# Altium footprint library Connectors.PcbLib: 218 footprints (part 3 of 14)
Each footprint in its own frame and in the unit in brackets; x right, y up, seen from the top. Pads: shape width x height; smd on the part's side, far side on the other; paste and mask are expansions set on the pad; w line width, h text height; cw(c..) or ccw(c..) is an arc to the next point about the centre after c.
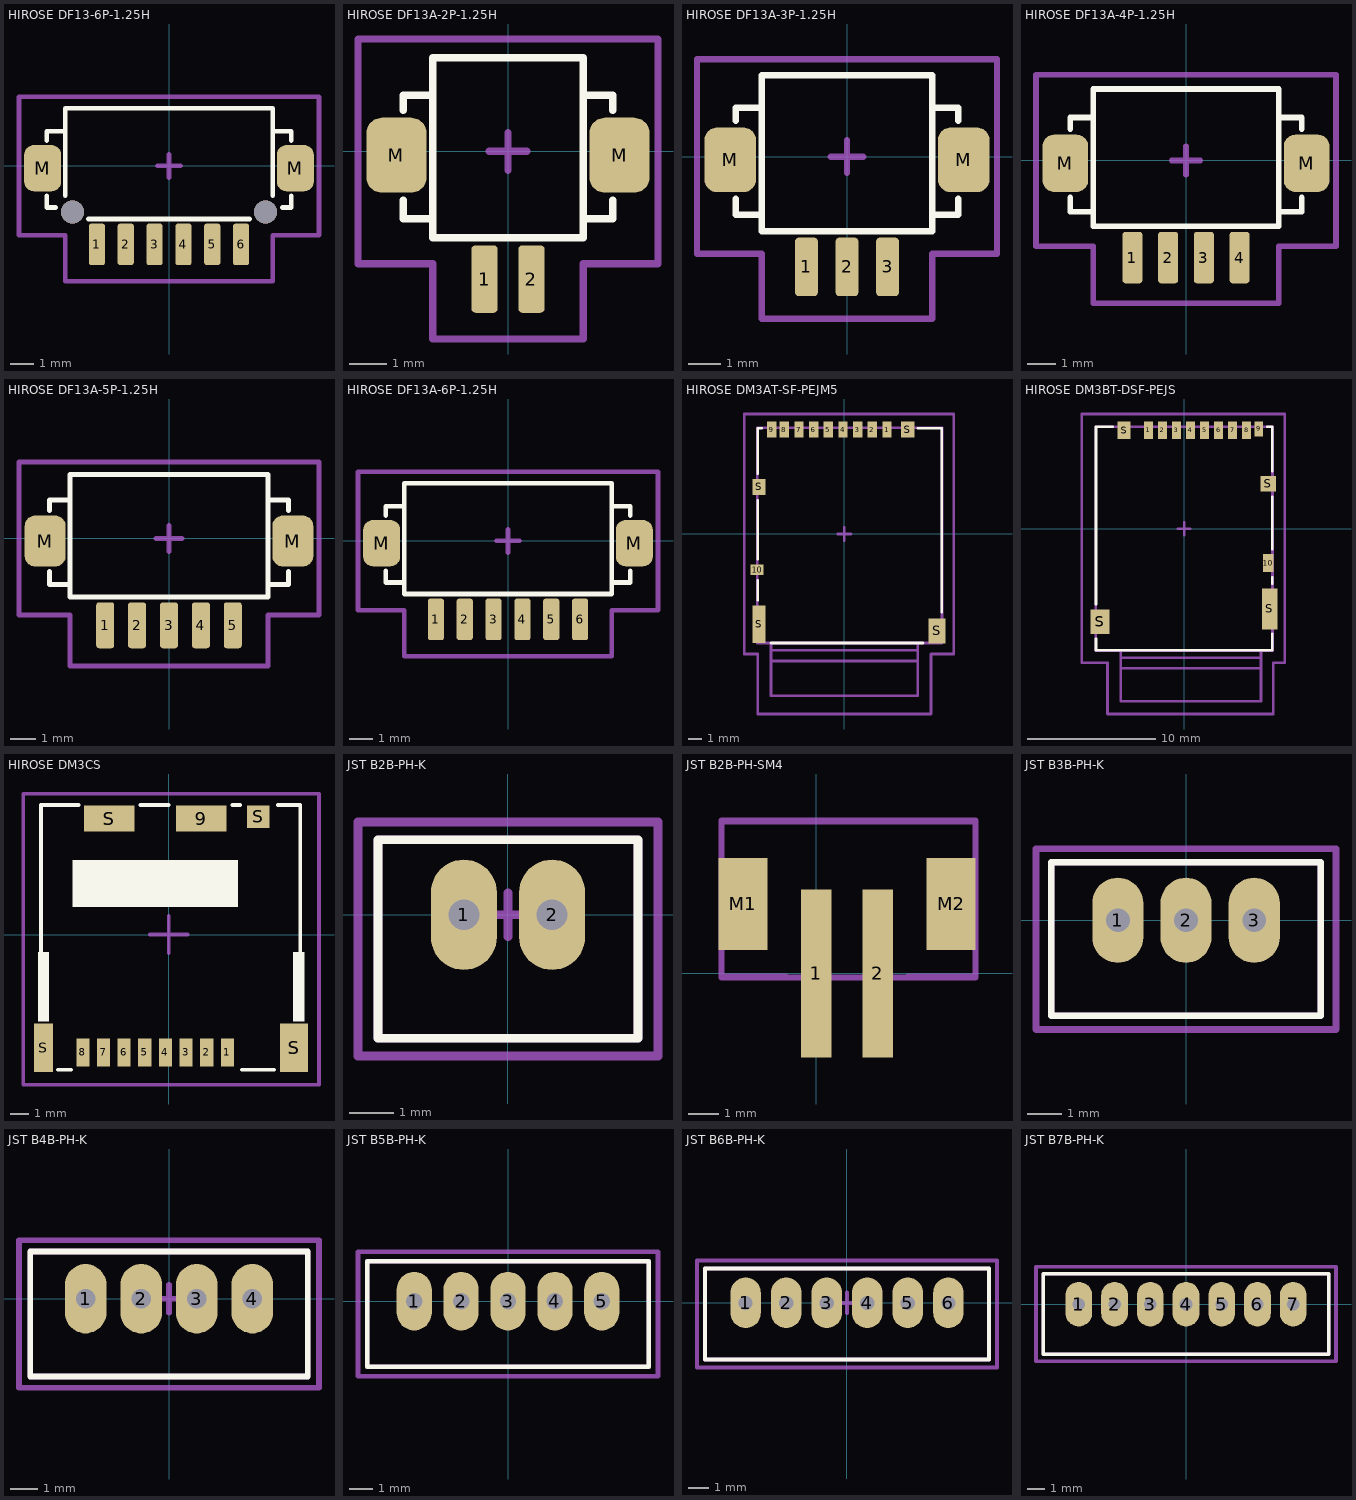
[diagram p2: the footprints below, top view; thin cyan lines are the x and y axes]

## HIROSE DF13-6P-1.25H [mm] "DF13 Series 1.25mm pitch miniature crimping connector single row"
height 3.6
pads (8):
  rrect30% 0.7x1.8 smd: 1(-3.125,-3.4) 2(-1.875,-3.4) 3(-0.625,-3.4) 4(0.625,-3.4) 5(1.875,-3.4) 6(3.125,-3.4)
  rrect50% 1.6x2 smd: M(-5.475,-0.1) M(5.475,-0.1)
via 4.175,-2 diameter 1 hole 1
via -4.175,-2 diameter 1 hole 1
Top Overlay:
  lines w0.2: -5.3,-1.3 -5.3,-1.8 -4.9,-1.8 ; -5.3,1.1 -5.3,1.5 -4.5,1.5 ; -4.5,-1.3 -4.5,2.5 -2.5,2.5 3.25,2.5 4.5,2.5 4.5,-1.3 ; -3.5,-2.3 -2.5,-2.3 -1.875,-2.3 1.8,-2.3 3.5,-2.3 ; 4.5,1.5 5.3,1.5 5.3,1.1 ; 4.9,-1.8 5.3,-1.8 5.3,-1.3
Mechanical 15:
  lines w0.2: -0.5,0 0.5,0 ; 0,-0.5 0,0.5 ; -6.5,-3 -4.5,-3 -4.5,-5 -2.5,-5 4.5,-5 4.5,-3 6.5,-3 6.5,2.5 6.5,3 5.25,3 -2.5,3 -6.5,3 -6.5,2.5 -6.5,-3
3D body: height 3.59, standoff -0.81, extent -6.075,-3.9 6.075,2.6

## HIROSE DF13A-2P-1.25H [mm] "DF13 Series 1.25mm pitch miniature crimping connector single row"
height 3.6
pads (4):
  rrect30% 0.7x1.8 smd: 1(-0.625,-3.4) 2(0.625,-3.4)
  rrect50% 1.6x2 smd: M(-2.975,-0.1) M(2.975,-0.1)
Top Overlay:
  lines w0.2: -2.8,-1.3 -2.8,-1.8 -2.4,-1.8 -2,-1.8 ; -2.8,1.1 -2.8,1.5 -2,1.5 ; 2,-1.9 2,-1.8 2.4,-1.8 2.8,-1.8 2.8,-1.3 ; 2,1.5 2.8,1.5 2.8,1.1 ; -2,-2.3 -2,-1.3 -2,2.5 0,2.5 2,2.5 2,-1.3 2,-2.3 1,-2.3 0,-2.3 -1,-2.3 -2,-2.3
Mechanical 15:
  lines w0.2: -0.5,0 0.5,0 ; 0,-0.5 0,0.5 ; -4,-3 -2,-3 -2,-5 0,-5 2,-5 2,-3 4,-3 4,2.5 4,3 0,3 -4,3 -4,2.5 -4,-3
3D body: height 3.59, standoff -0.01, extent -3.575,-3.9 3.575,2.6

## HIROSE DF13A-3P-1.25H [mm] "DF13 Series 1.25mm pitch miniature crimping connector single row"
height 3.6
pads (5):
  rrect30% 0.7x1.8 smd: 1(-1.25,-3.4) 2(0,-3.4) 3(1.25,-3.4)
  rrect50% 1.6x2 smd: M(-3.6,-0.1) M(3.6,-0.1)
Top Overlay:
  lines w0.2: -3.425,-1.3 -3.425,-1.8 -3.025,-1.8 -2.625,-1.8 ; -3.425,1.1 -3.425,1.5 -2.625,1.5 ; 2.625,1.5 3.425,1.5 3.425,1.1 ; 3.425,-1.3 3.425,-1.8 3.025,-1.8 2.625,-1.8 ; -2.625,-1.8 -2.625,-1.3 -2.625,2.5 -0.625,2.5 1.375,2.5 2.625,2.5 2.625,-1.3 2.625,-1.8 ; -2.625,-1.8 -2.625,-2.3 -1.625,-2.3 -0.625,-2.3 0,-2.3 0.625,-2.3 1.625,-2.3 2.625,-2.3 2.625,-1.8
Mechanical 15:
  lines w0.2: -0.5,0 0.5,0 ; 0,-0.5 0,0.5 ; -4.625,-3 -2.625,-3 -2.625,-5 -0.625,-5 2.625,-5 2.625,-3 4.625,-3 4.625,2.5 4.625,3 3.375,3 -0.625,3 -4.625,3 -4.625,2.5 -4.625,-3
3D body: height 3.59, standoff -0.01, extent -4.2,-3.9 4.2,2.6

## HIROSE DF13A-4P-1.25H [mm] "DF13 Series 1.25mm pitch miniature crimping connector single row"
height 3.6
pads (6):
  rrect30% 0.7x1.8 smd: 1(-1.875,-3.4) 2(-0.625,-3.4) 3(0.625,-3.4) 4(1.875,-3.4)
  rrect50% 1.6x2 smd: M(-4.225,-0.1) M(4.225,-0.1)
Top Overlay:
  lines w0.2: -4.05,-1.3 -4.05,-1.8 -3.65,-1.8 -3.25,-1.8 ; -4.05,1.1 -4.05,1.5 -3.25,1.5 ; 3.25,1.5 4.05,1.5 4.05,1.1 ; 4.05,-1.3 4.05,-1.8 3.65,-1.8 3.25,-1.8 ; -3.25,-1.8 -3.25,-2.3 -2.25,-2.3 -1.25,-2.3 -0.625,-2.3 1.25,-2.3 2.25,-2.3 3.25,-2.3 3.25,-1.8 ; -3.25,-1.8 -3.25,-1.3 -3.25,2.5 -1.25,2.5 2,2.5 3.25,2.5 3.25,-1.3 3.25,-1.8
Mechanical 15:
  lines w0.2: -0.5,0 0.5,0 ; 0,-0.5 0,0.5 ; -5.25,-3 -3.25,-3 -3.25,-5 -1.25,-5 3.25,-5 3.25,-3 5.25,-3 5.25,2.5 5.25,3 4,3 -1.25,3 -5.25,3 -5.25,2.5 -5.25,-3
3D body: height 3.59, standoff -0.01, extent -4.825,-3.9 4.825,2.6

## HIROSE DF13A-5P-1.25H [mm] "DF13 Series 1.25mm pitch miniature crimping connector single row"
height 3.6
pads (7):
  rrect30% 0.7x1.8 smd: 1(-2.5,-3.4) 2(-1.25,-3.4) 3(0,-3.4) 4(1.25,-3.4) 5(2.5,-3.4)
  rrect50% 1.6x2 smd: M(-4.85,-0.1) M(4.85,-0.1)
Top Overlay:
  lines w0.2: -4.675,-1.3 -4.675,-1.8 -4.275,-1.8 -3.875,-1.8 ; -4.675,1.1 -4.675,1.5 -3.875,1.5 ; 3.875,1.5 4.675,1.5 4.675,1.1 ; 4.675,-1.3 4.675,-1.8 4.275,-1.8 3.875,-1.8 ; -3.875,-1.8 -3.875,-2.3 -2.875,-2.3 -1.875,-2.3 -1.25,-2.3 1.875,-2.3 2.875,-2.3 3.875,-2.3 3.875,-1.8 ; -3.875,-1.8 -3.875,-1.3 -3.875,2.5 -1.875,2.5 2.625,2.5 3.875,2.5 3.875,-1.3 3.875,-1.8
Mechanical 15:
  lines w0.2: -0.5,0 0.5,0 ; 0,-0.5 0,0.5 ; -5.875,-3 -3.875,-3 -3.875,-5 -1.875,-5 3.875,-5 3.875,-3 5.875,-3 5.875,2.5 5.875,3 4.625,3 -1.875,3 -5.875,3 -5.875,2.5 -5.875,-3
3D body: height 3.59, standoff -0.01, extent -5.45,-3.9 5.45,2.6

## HIROSE DF13A-6P-1.25H [mm] "DF13 Series 1.25mm pitch miniature crimping connector single row"
height 3.6
pads (8):
  rrect30% 0.7x1.8 smd: 1(-3.125,-3.4) 2(-1.875,-3.4) 3(-0.625,-3.4) 4(0.625,-3.4) 5(1.875,-3.4) 6(3.125,-3.4)
  rrect50% 1.6x2 smd: M(-5.475,-0.1) M(5.475,-0.1)
Top Overlay:
  lines w0.2: -5.3,-1.3 -5.3,-1.8 -4.9,-1.8 -4.5,-1.8 ; -5.3,1.1 -5.3,1.5 -4.5,1.5 ; 4.5,-1.8 4.9,-1.8 5.3,-1.8 5.3,-1.3 ; 4.5,1.5 5.3,1.5 5.3,1.1 ; -4.5,-2.3 -3.5,-2.3 -2.5,-2.3 -1.875,-2.3 1.8,-2.3 3.5,-2.3 4.5,-2.3 4.5,-1.3 4.5,2.5 3.25,2.5 -2.5,2.5 -4.5,2.5 -4.5,-1.3 -4.5,-2.3
Mechanical 15:
  lines w0.2: -0.5,0 0.5,0 ; 0,-0.5 0,0.5 ; -6.5,-3 -4.5,-3 -4.5,-5 -2.5,-5 4.5,-5 4.5,-3 6.5,-3 6.5,2.5 6.5,3 5.25,3 -2.5,3 -6.5,3 -6.5,2.5 -6.5,-3
3D body: height 3.59, standoff -0.01, extent -6.075,-3.9 6.075,2.6

## HIROSE DM3AT-SF-PEJM5 [mm]
height 1.68
pads (14):
  rect 0.7x1.2 smd: 1(3.2,7.825) 2(2.1,7.825) 3(1,7.825) 4(-0.1,7.825) 5(-1.2,7.825) 6(-2.3,7.825) 7(-3.4,7.825) 8(-4.5,7.825) 9(-5.45,7.825)
  rect 1x0.8 smd: 10(-6.55,-2.675)
  rect 1x2.8 smd: S(-6.4,-6.775)
  rect 1x1.2 smd: S(-6.4,3.525) S(4.75,7.825)
  rect 1.3x1.9 smd: S(6.95,-7.275)
Top Overlay:
  lines w0.2: -6.5,-4.975 -6.5,-3.475 ; -6.5,-1.875 -6.5,2.525 ; -6.5,4.525 -6.5,7.925 -6.2,7.925 ; -5.5,-8.175 5.9,-8.175 ; 5.5,7.925 7.3,7.925 7.3,-5.875
Mechanical 13:
  lines w0.2: -5.5,-8.725 5.5,-8.725 ; -5.5,-8.175 -5.5,-9.525 ; 5.5,-8.175 5.5,-9.525 ; -5.5,-9.525 5.5,-9.525 ; -5.5,-9.525 -5.5,-12.125 5.5,-12.125 5.5,-9.525 ; -6.525,-8.175 7.325,-8.175 7.325,7.975 -6.525,7.975 -6.525,-8.175
Mechanical 15:
  lines w0.2: -0.5,0 0.5,0 ; 0,-0.5 0,0.5 ; -7.5,-9 -7.5,-8.5 -7.5,9 8.2,9 8.2,-8 8.2,-9 6.5,-9 6.5,-13.5 -6.5,-13.5 -6.5,-9 -7.5,-9
3D body: height 1.68, standoff 0, extent -6.525,-8.175 7.325,7.975

## HIROSE DM3BT-DSF-PEJS [mm]
height 2.38
pads (14):
  rect 0.7x1.4 smd: 1(-2.8,7.725) 2(-1.7,7.725) 3(-0.6,7.725) 4(0.5,7.725) 5(1.6,7.725) 6(2.7,7.725) 7(3.8,7.725) 8(4.9,7.725)
  rect 0.7x1.2 smd: 9(5.85,7.825)
  rect 0.8x1.4 smd: 10(6.6,-2.675)
  rect 1.5x1.9 smd: S(-6.6,-7.275)
  rect 1x1.4 smd: S(-4.7,7.725)
  rect 1.2x1.2 smd: S(6.6,3.525)
  rect 1.2x3.2 smd: S(6.7,-6.275)
Top Overlay:
  lines w0.2: -6.9,-8.6 -6.9,-9.5 6.9,-9.5 6.9,-8.2 ; -6.9,-5.9 -6.9,8 -5.6,8 ; 6.5,8 6.9,8 6.9,4.5 ; 6.9,-4.3 6.9,-3.8 ; 6.9,-1.6 6.9,2.5
Mechanical 13:
  lines w0.2: -4.975,-10.1 6.025,-10.1 ; -4.975,-9.55 -4.975,-10.9 ; 6.025,-9.55 6.025,-10.9 ; -4.975,-10.9 -4.975,-13.5 6.025,-13.5 6.025,-10.9 ; -4.975,-10.9 6.025,-10.9 ; -6.925,-9.55 -6.925,8 6.925,8 6.925,-9.55 -6.925,-9.55
Mechanical 15:
  lines w0.2: -0.5,0 0.5,0 ; 0,-0.5 0,0.5 ; -8,-10.5 -8,9 7.9,9 7.9,-10.5 7,-10.5 7,-14.5 -6,-14.5 -6,-10.5 -8,-10.5
3D body: height 1.83, standoff 0, extent -6.925,-9.55 6.925,8

## HIROSE DM3CS [mm]
height 1.83
pads (13):
  rect 0.7x1.5 smd: 1(3.125,-6.275) 2(2.025,-6.275) 3(0.925,-6.275) 4(-0.175,-6.275) 5(-1.275,-6.275) 6(-2.375,-6.275) 7(-3.475,-6.275) 8(-4.575,-6.275)
  rect 2.7x1.4 smd: 9(1.725,6.175) S(-3.175,6.175)
  rect 1x2.6 smd: S(-6.675,-6.025)
  rect 1.2x1.2 smd: S(4.775,6.275)
  rect 1.5x2.6 smd: S(6.675,-6.025)
Top Overlay:
  rectangle: 6.625,-4.625 7.225,-0.925
  rectangle: -6.975,-4.625 -6.375,-0.925
  rectangle: -5.125,1.475 3.675,3.975
  lines w0.2: -6.7,-4.4 -6.8,-4.3 -6.8,6.9 -4.8,6.9 ; -5.9,-7.2 -5.2,-7.2 ; -1.5,6.9 0,6.9 ; 3.4,6.9 3.8,6.9 ; 3.9,-7.2 5.6,-7.2 ; 5.8,6.9 7,6.9 7,-4.4
Mechanical 15:
  lines w0.2: -1,0 1,0 ; 0,-1 0,1 ; -7.75,-8 -7.75,7.5 8,7.5 8,-8 -7.75,-8
3D body: height 1.93, standoff 0, extent -6.8,-7.2 7,6.9

## JST B2B-PH-K [mm]
height 6
pads (2):
  oval 1.5x2.5 hole 0.7: 1(-1,0) 2(1,0)
Top Overlay:
  lines w0.2: -2.95,-2.8 -2.95,1.7 2.95,1.7 2.95,-2.8 -2.95,-2.8
Bottom Overlay:
  circle w0.254: c-2.1,1.1 r0.141
Mechanical 13:
  lines w0.2: -2.95,-2.8 2.95,-2.8 2.95,1.7 -2.95,1.7 -2.95,-2.8
Mechanical 15:
  lines w0.2: -0.5,0 0.5,0 ; 0,-0.5 0,0.5 ; -3.4,-3.2 3.4,-3.2 3.4,2.1 -3.4,2.1 -3.4,-3.2
3D body: height 6, standoff -3.4, extent -2.95,-2.8 2.95,1.7

## JST B2B-PH-SM4 [mm]
height 6.6
pads (4):
  rect 1x5.5 smd: 1(0,0) 2(2,0)
  rect 1.6x3 smd: M1(-2.4,2.27) M2(4.4,2.27)
Bottom Overlay:
  circle w0.254: c-0.084,3.608 r0.141
Mechanical 8:
  lines w0.203: -3.1,-0.13 5.2,-0.13 5.2,4.97 -3.1,4.97 -3.1,-0.13
Mechanical 22:
  lines w0.203: -3.1,0.2 -3.1,-0.1 -1,-0.1 ; -3.1,4.3 -3.1,5 5.2,5 5.2,4.3 ; 3,-0.1 5.2,-0.1 5.2,0.3
3D body: height 6.6, standoff 0, extent -2.934,-2.138 5.016,4.862

## JST B3B-PH-K [mm]
height 6
pads (3):
  oval 1.5x2.5 hole 0.7: 1(-2,0) 2(0,0) 3(2,0)
Top Overlay:
  lines w0.2: -3.95,-2.8 3.95,-2.8 3.95,1.7 -3.95,1.7 -3.95,-2.8
Bottom Overlay:
  circle w0.254: c-3.1,1.1 r0.141
Mechanical 13:
  lines w0.2: -3.95,-2.8 -3.95,1.7 3.95,1.7 3.95,-2.8 -3.95,-2.8
Mechanical 15:
  lines w0.2: -0.5,0 0.5,0 ; 0,-0.5 0,0.5 ; -4.4,-3.2 -4.4,2.1 4.4,2.1 4.4,-3.2 -4.4,-3.2
3D body: height 6, standoff -3.4, extent -3.95,-2.8 3.95,1.7

## JST B4B-PH-K [mm]
height 6
pads (4):
  oval 1.5x2.5 hole 0.7: 1(-3,0) 2(-1,0) 3(1,0) 4(3,0)
Top Overlay:
  lines w0.2: -5,-2.8 5,-2.8 5,1.7 -5,1.7 -5,-2.8
Bottom Overlay:
  circle w0.254: c-4.1,1.1 r0.141
Mechanical 13:
  lines w0.2: -5,-2.8 -5,1.7 5,1.7 5,-2.8 -5,-2.8
Mechanical 15:
  lines w0.2: -0.5,0 0.5,0 ; 0,-0.5 0,0.5 ; -5.4,-3.2 -5.4,2.1 5.4,2.1 5.4,-3.2 -5.4,-3.2
3D body: height 6, standoff -3.4, extent -4.95,-2.8 4.95,1.7

## JST B5B-PH-K [mm]
height 6
pads (5):
  oval 1.5x2.5 hole 0.7: 1(-4,0) 2(-2,0) 3(0,0) 4(2,0) 5(4,0)
Top Overlay:
  lines w0.2: -6,-2.8 -6,1.7 6,1.7 6,-2.8 -6,-2.8
Bottom Overlay:
  circle w0.254: c-5.1,1.1 r0.141
Mechanical 13:
  lines w0.2: -6,-2.8 6,-2.8 6,1.7 -6,1.7 -6,-2.8
Mechanical 15:
  lines w0.2: -0.5,0 0.5,0 ; 0,-0.5 0,0.5 ; -6.4,-3.2 6.4,-3.2 6.4,2.1 -6.4,2.1 -6.4,-3.2
3D body: height 6, standoff -3.4, extent -5.95,-2.8 5.95,1.7

## JST B6B-PH-K [mm]
height 6
pads (6):
  oval 1.5x2.5 hole 0.7: 1(-5,0) 2(-3,0) 3(-1,0) 4(1,0) 5(3,0) 6(5,0)
Top Overlay:
  lines w0.2: -7,-2.8 -7,1.7 7,1.7 7,-2.8 -7,-2.8
Bottom Overlay:
  circle w0.254: c-6.1,1.1 r0.141
Mechanical 13:
  lines w0.2: 6.95,-2.8 -7,-2.8 -7,1.7 7,1.7 7,-2.8
Mechanical 15:
  lines w0.2: -0.5,0 0.5,0 ; 0,-0.5 0,0.5 ; -7.4,-3.2 7.4,-3.2 7.4,2.1 -7.4,2.1 -7.4,-3.2
3D body: height 6, standoff -3.4, extent -6.95,-2.8 6.95,1.7

## JST B7B-PH-K [mm]
height 6
pads (7):
  oval 1.5x2.5 hole 0.7: 1(-6,0) 2(-4,0) 3(-2,0) 4(0,0) 5(2,0) 6(4,0) 7(6,0)
Top Overlay:
  lines w0.2: -8,-2.8 8,-2.8 8,1.7 -8,1.7 -8,-2.8
Bottom Overlay:
  circle w0.254: c-7.1,1.1 r0.141
Mechanical 13:
  lines w0.2: -8,-2.8 -8,1.7 8,1.7 8,-2.8 -8,-2.8
Mechanical 15:
  lines w0.2: -0.5,0 0.5,0 ; 0,-0.5 0,0.5 ; -8.4,-3.2 -8.4,2.1 8.4,2.1 8.4,-3.2 -8.4,-3.2
3D body: height 6, standoff -3.4, extent -7.95,-2.8 7.95,1.7